# Altium footprint library Footprints.PcbLib: 76 footprints (part 4 of 5)
Each footprint in its own frame and in the unit in brackets; x right, y up, seen from the top. Pads: shape width x height; smd on the part's side, far side on the other; paste and mask are expansions set on the pad; w line width, h text height; cw(c..) or ccw(c..) is an arc to the next point about the centre after c.
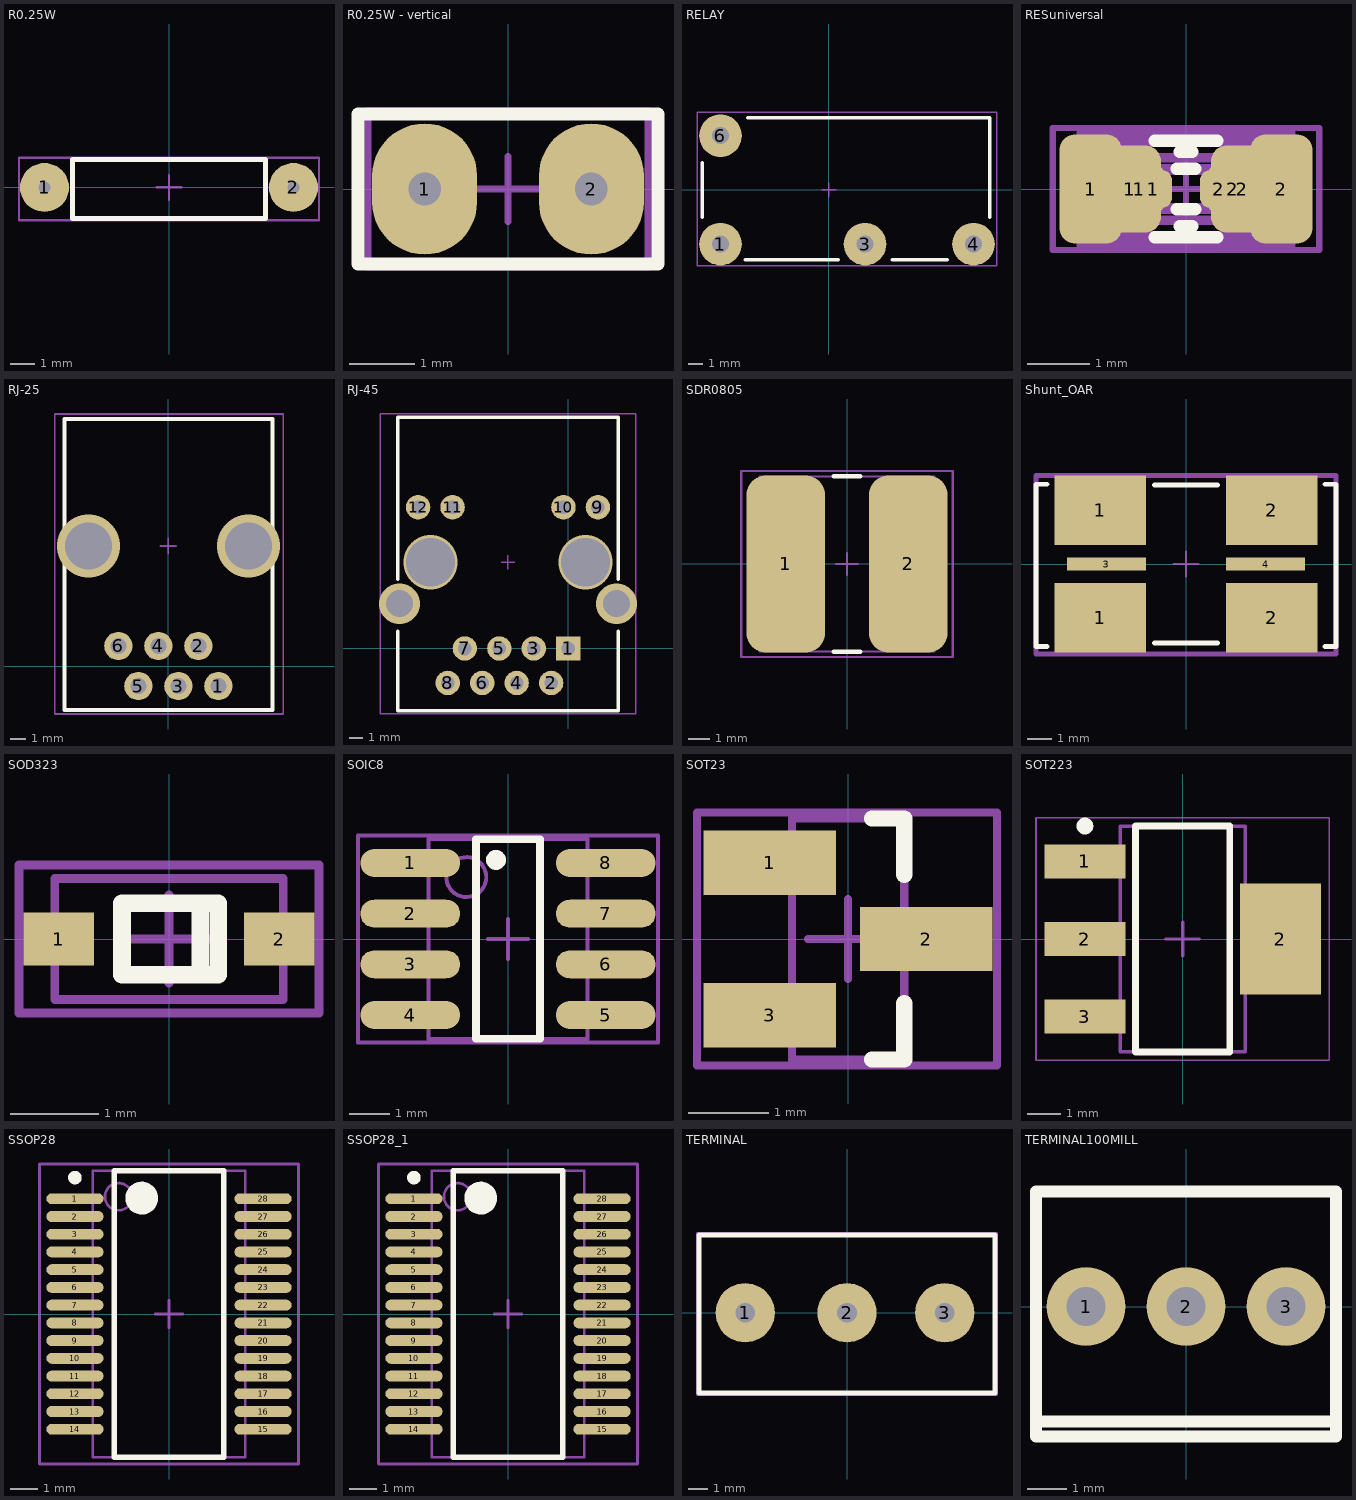
[diagram p3: the footprints below, top view; thin cyan lines are the x and y axes]

## R0.25W [mm] "Resistor, Axial; Body 10.5 x 3.3 mm (LxDia. max), Lead Dia. 0.7 mm (max)"
height 3.3
pads (2):
  round 2 hole 0.5: 1(-5.08,0) 2(5.08,0)
Top Overlay:
  lines w0.2: -3.937,-1.27 3.937,-1.27 3.937,1.143 -3.937,1.143 -3.937,-1.27
Mechanical 15:
  lines w0.1: -0.5,0 0.5,0 ; 0,-0.5 0,0.5 ; -6.121,-1.346 6.121,-1.346 6.121,1.219 -6.121,1.219 -6.121,-1.346
3D body "User Library-AXIAL_RESISTOR(0_25W).step": height 2.6, standoff -1.5, extent -5.4,-1.206 5.4,1.194

## R0.25W - vertical [mm] "Resistor, Axial; Body 10.5 x 3.3 mm (LxDia. max), Lead Dia. 0.7 mm (max)"
height 9
pads (2):
  oval 1.6x2 hole 0.5: 1(-1.27,0) 2(1.27,0)
Top Overlay:
  lines w0.2: -2.286,-1.143 -2.286,1.143 2.286,1.143 2.286,-1.143 -2.286,-1.143
Mechanical 15:
  lines w0.1: -0.5,0 0.5,0 ; 0,-0.5 0,0.5 ; -2.134,-1.194 -2.134,1.194 2.134,1.194 2.134,-1.194 -2.134,-1.194
3D body "User Library-Res_Stand.step": height 7.05, standoff -1.7, extent -2.192,-0.92 1.52,0.921

## RELAY [mm] "G6B-1177P(-FD)-ND-US"
height 15
pads (4):
  round 3 hole 1.2 paste+0 mask+0: 1(-7.62,-3.81) 3(2.54,-3.81) 4(10.16,-3.81) 6(-7.62,3.81)
Top Overlay:
  lines w0.254: -8.89,-1.905 -8.89,1.905 ; -5.875,-4.92 0.635,-4.92 ; -5.715,5.08 11.31,5.08 11.31,-1.905 ; 4.445,-4.92 8.295,-4.92
Mechanical 15:
  lines w0.1: -0.5,0 0.5,0 ; 0,-0.5 0,0.5 ; -9.271,-5.334 -9.271,5.461 11.811,5.461 11.811,-5.334 -9.271,-5.334
3D body: height 15, standoff 0, extent -8.89,-4.928 11.303,5.08

## RESuniversal [mm] "Chip Resistor 2-Leads, All sizes"
height 1.5
pads (8):
  rrect50% 1x1.75 smd: 1(-1.527,0) 2(1.527,0)
  rrect50% 1x1.4 smd: 1(-0.902,0) 2(0.902,0)
  rrect50% 0.8x0.85 smd: 1(-0.75,0) 2(0.75,0)
  rrect50% 0.6x0.6 smd: 1(-0.525,0) 2(0.525,0)
Top Overlay:
  lines w0.2: -0.5,-0.775 0.5,-0.775 ; -0.5,0.775 0.5,0.775 ; -0.15,-0.325 0.15,-0.325 ; -0.15,0.325 0.15,0.325 ; -0.1,-0.6 0.1,-0.6 ; -0.1,0.6 0.1,0.6
Mechanical 13:
  lines w0.1: -1.7,-0.9 1.7,-0.9 1.7,0.9 -1.7,0.9 -1.7,-0.9 ; -1.105,-0.725 1.105,-0.725 1.105,0.725 -1.105,0.725 -1.105,-0.725 ; -0.875,-0.475 -0.875,0.475 0.875,0.475 0.875,-0.475 -0.875,-0.475 ; -0.55,-0.275 -0.55,0.275 0.55,0.275 0.55,-0.275 -0.55,-0.275
Mechanical 15:
  lines w0.1: -0.475,0 0.475,0 ; -0.275,0 0.275,0 ; 0,-0.475 0,0.475 ; 0,-0.275 0,0.275 ; -2.134,-0.975 2.134,-0.975 2.134,0.975 -2.134,0.975 -2.134,-0.975 ; -1.473,-0.8 1.473,-0.8 1.473,0.8 -1.473,0.8 -1.473,-0.8 ; -1.225,-0.525 -1.225,0.525 1.225,0.525 1.225,-0.525 -1.225,-0.525 ; -0.925,-0.35 -0.925,0.35 0.925,0.35 0.925,-0.35 -0.925,-0.35 ; -0.5,0 0.5,0 -0.5,0 ; 0,-0.5 0,0.5 0,-0.5
3D body "1206 RES.step": height 0.55, standoff 0, extent -1.6,-0.8 1.6,0.8

## RJ-25 [mm] "RJ-25 ICD programmer connector"
height 12
pads (6):
  round 1.8 hole 1: 1(3.175,-1.27) 2(1.905,1.27) 3(0.635,-1.27) 4(-0.635,1.27) 5(-1.905,-1.27) 6(-3.175,1.27)
via -5.08,7.62 diameter 4 hole 3
via 5.08,7.62 diameter 4 hole 3
Top Overlay:
  lines w0.254: -6.604,15.697 -6.604,2.54 -6.604,-2.794 6.604,-2.794 6.604,2.54 6.604,15.697 ; -6.579,15.697 6.579,15.697
Mechanical 15:
  lines w0.1: -0.5,7.62 0.5,7.62 ; 0,7.12 0,8.12 ; -7.214,-3.048 7.29,-3.048 7.29,16.002 -7.214,16.002 -7.214,-3.048
3D body "User Library-XA53A-66-100111.STEP": height 11.5, standoff -3.8, extent -6.585,-2.541 6.715,15.659

## RJ-45 [mm] "RJ-45 Ethernet connector"
height 15
pads (12):
  rect 1.8x1.8 hole 1: 1(0,0)
  round 1.8 hole 1: 2(-1.27,-2.54) 3(-2.54,0) 4(-3.81,-2.54) 5(-5.08,0) 6(-6.35,-2.54) 7(-7.62,0) 8(-8.89,-2.54) 9(2.18,10.41) 10(-0.36,10.41) 11(-8.53,10.41) 12(-11.07,10.41)
via -12.433,3.302 diameter 3 hole 2
via 3.543,3.302 diameter 3 hole 2
via -10.16,6.35 diameter 4 hole 3.6
via 1.27,6.35 diameter 4 hole 3.6
Top Overlay:
  lines w0.254: -12.573,1.27 -12.573,-4.572 3.683,-4.572 3.683,1.27 ; -12.573,5.08 -12.573,17.018 3.683,17.018 3.683,5.08
Mechanical 15:
  lines w0.1: -4.945,6.35 -3.945,6.35 ; -4.445,5.85 -4.445,6.85 ; -13.843,-4.826 4.953,-4.826 4.953,17.272 -13.843,17.272 -13.843,-4.826
3D body "45857.stp": height 14.9, standoff -3.28, extent -13.608,-4.69 4.718,17.15

## SDR0805 [mm] "Precision Wire Wound Inductor, 2-Leads, Body 7,9x7,9mm, IPC Medium Density"
height 5.3
pads (2):
  rrect50% 3.6x8.1 smd: 1(-2.8,0) 2(2.8,0)
Top Overlay:
  lines w0.2: -0.6,-4 0.6,-4 ; -0.6,4 0.6,4
Mechanical 13:
  lines w0.1: -4,-4 -4,4 4,4 4,-4 -4,-4
Mechanical 15:
  lines w0.1: -0.5,0 0.5,0 ; 0,-0.5 0,0.5 ; -4.825,-4.25 -4.825,4.25 4.825,4.25 4.825,-4.25 -4.825,-4.25
3D body "SDR0805.step": height 5.05, standoff 0, extent -3.677,-3.75 3.677,3.75

## Shunt_OAR [mm] "Open Air Sense Resistors  Metal Alloy Strip 5W 12mmx7mm"
height 5
pads (6):
  rect 3.67x2.79 smd: 1(-3.45,-2.155) 1(-3.45,2.155) 2(3.45,-2.155) 2(3.45,2.155)
  rect 3.16x0.51 smd: 3(-3.195,0) 4(3.195,0)
Top Overlay:
  lines w0.2: -6.02,-0.737 -6.02,3.2 -5.588,3.2 ; -6.02,0.635 -6.02,-3.302 -5.588,-3.302 ; -1.27,-3.175 1.27,-3.175 ; -1.27,3.175 1.27,3.175 ; 5.588,-3.302 6.02,-3.302 6.02,0.635 ; 5.588,3.2 6.02,3.2 6.02,-0.737
Mechanical 15:
  lines w0.1: -0.5,0 0.5,0 ; 0,-0.5 0,0.5
  lines w0.2: -6.02,-3.607 -5.08,-3.607 6.02,-3.607 6.02,-2.87 6.02,3.556 3.632,3.556 -6.02,3.556 -6.02,-3.073 -6.02,-3.607
3D body "RES_OARS-XP.step": height 4.57, standoff 0, extent -6,-3.175 6,3.175

## SOD323 [mm] "SOD323 diode 2.5mmx1.25mm"
height 1.1
pads (2):
  rect 0.8x0.6 smd: 1(-1.25,0) 2(1.25,0)
Top Overlay:
  lines w0.2: 0.356,-0.356 0.356,0.406 ; -0.533,-0.406 -0.533,0.406 0.559,0.406 0.559,-0.406 -0.533,-0.406
Mechanical 13:
  lines w0.1: -1.295,-0.686 -1.295,0.686 1.295,0.686 1.295,-0.686 -1.295,-0.686
Mechanical 15:
  lines w0.1: -0.5,0 0.5,0 ; 0,-0.5 0,0.5 ; -1.702,-0.838 -1.702,0.838 1.702,0.838 1.702,-0.838 -1.702,-0.838
3D body "SOD323.step": height 1.1, standoff 0, extent -1.3,-0.675 1.3,0.675

## SOIC8 [mm] "SOIC, 8-Leads, Body 5,0x4,0mm (max), Pitch 1,27mm, IPC Low Density"
height 1.76
pads (8):
  oval 2.5x0.7 smd: 1(-2.45,1.905) 2(-2.45,0.635) 3(-2.45,-0.635) 4(-2.45,-1.905) 5(2.45,-1.905) 6(2.45,-0.635) 7(2.45,0.635) 8(2.45,1.905)
Top Overlay:
  circle w0.25: c-0.303,1.981 r0.125
  lines w0.2: -0.8,-2.5 -0.8,2.5 0.8,2.5 0.8,-2.5 -0.8,-2.5
Mechanical 13:
  circle w0.1: c-1.045,1.55 r0.5
  lines w0.1: -1.995,-2.5 -1.995,2.5 1.995,2.5 1.995,-2.5 -1.995,-2.5
Mechanical 15:
  lines w0.1: -0.5,0 0.5,0 ; 0,-0.5 0,0.5 ; -3.759,-2.591 -3.759,2.591 3.759,2.591 3.759,-2.591 -3.759,-2.591
3D body "SOIC-8.step": height 1.75, standoff 0, extent -3,-2.45 3,2.45

## SOT23 [mm] "SOT23, 3-Leads, Body 3,0x2,5mm (max), Pitch 0,95mm, IPC Low Density"
height 1.1
pads (3):
  rect 1.65x0.8 smd: 1(-0.975,0.95) 2(0.975,0) 3(-0.975,-0.95)
Top Overlay:
  lines w0.2: 0.3,-1.5 0.7,-1.5 0.7,-0.8 ; 0.3,1.5 0.7,1.5 0.7,0.8
Mechanical 13:
  lines w0.1: -0.7,-1.5 -0.7,1.5 0.7,1.5 0.7,-1.5 -0.7,-1.5
Mechanical 15:
  lines w0.1: -0.5,0 0.5,0 ; 0,-0.5 0,0.5 ; -1.88,-1.575 -1.88,1.575 1.854,1.575 1.854,-1.575 -1.88,-1.575
3D body "SOT23-3.step": height 1.08, standoff 0, extent -1.32,-1.5 1.32,1.5

## SOT223 [mm] "SOT223, 4-Leads, Body 6.5x3.5mm, Pitch 2.3mm, Lead Span 7mm, IPC Medium Density"
height 1.8
pads (4):
  rect 2.4x1 smd: 1(-2.9,2.3) 2(-2.9,0) 3(-2.9,-2.3)
  rect 2.4x3.3 smd: 2(2.9,0)
Top Overlay:
  circle w0.25: c-2.9,3.35 r0.125
  lines w0.2: -1.4,-3.35 -1.4,3.35 1.4,3.35 1.4,-3.35 -1.4,-3.35
Mechanical 13:
  lines w0.1: -1.855,-3.35 -1.855,3.35 1.855,3.35 1.855,-3.35 -1.855,-3.35
Mechanical 15:
  lines w0.05: -4.35,-3.6 -4.35,3.6 4.35,3.6 4.35,-3.6 -4.35,-3.6
  lines w0.1: -0.5,0 0.5,0 ; 0,-0.5 0,0.5
3D body "SOT-223.step": height 1.64, standoff -0.01, extent -3.5,-3.25 3.5,3.25

## SSOP28 [mm] "SOP, 28-Leads, Body 10,5x5,6mm (max), Pitch 0,65mm, IPC Medium Density"
height 2
pads (28):
  oval 2.1x0.4 smd mask+0.05: 1(-3.45,4.225) 2(-3.45,3.575) 3(-3.45,2.925) 4(-3.45,2.275) 5(-3.45,1.625) 6(-3.45,0.975) 7(-3.45,0.325) 8(-3.45,-0.325) 9(-3.45,-0.975) 10(-3.45,-1.625) 11(-3.45,-2.275) 12(-3.45,-2.925) 13(-3.45,-3.575) 14(-3.45,-4.225) 15(3.45,-4.225) 16(3.45,-3.575) 17(3.45,-2.925) 18(3.45,-2.275) 19(3.45,-1.625) 20(3.45,-0.975) 21(3.45,-0.325) 22(3.45,0.325) 23(3.45,0.975) 24(3.45,1.625) 25(3.45,2.275) 26(3.45,2.925) 27(3.45,3.575) 28(3.45,4.225)
Top Overlay:
  circle w0.25: c-3.45,5 r0.125
  circle w0.6: c-1,4.25 r0.3
  lines w0.2: -2,-5.25 -2,5.25 2,5.25 2,-5.25 -2,-5.25
Mechanical 13:
  circle w0.1: c-1.85,4.3 r0.5
  lines w0.1: -2.8,-5.25 -2.8,5.25 2.8,5.25 2.8,-5.25 -2.8,-5.25
Mechanical 15:
  lines w0.1: -0.5,0 0.5,0 ; 0,-0.5 0,0.5 ; -4.75,-5.5 -4.75,5.5 4.75,5.5 4.75,-5.5 -4.75,-5.5
3D body "SSOP-28-1.step": height 2.15, standoff 0, extent -3.878,-5.207 3.878,5.123

## SSOP28_1 [mm] "SOP, 28-Leads, Body 10,5x5,6mm (max), Pitch 0,65mm, IPC Medium Density"
height 2
pads (28):
  oval 2.1x0.4 smd mask+0.05: 1(-3.45,4.225) 2(-3.45,3.575) 3(-3.45,2.925) 4(-3.45,2.275) 5(-3.45,1.625) 6(-3.45,0.975) 7(-3.45,0.325) 8(-3.45,-0.325) 9(-3.45,-0.975) 10(-3.45,-1.625) 11(-3.45,-2.275) 12(-3.45,-2.925) 13(-3.45,-3.575) 14(-3.45,-4.225) 15(3.45,-4.225) 16(3.45,-3.575) 17(3.45,-2.925) 18(3.45,-2.275) 19(3.45,-1.625) 20(3.45,-0.975) 21(3.45,-0.325) 22(3.45,0.325) 23(3.45,0.975) 24(3.45,1.625) 25(3.45,2.275) 26(3.45,2.925) 27(3.45,3.575) 28(3.45,4.225)
Top Overlay:
  circle w0.25: c-3.45,5 r0.125
  circle w0.6: c-1,4.25 r0.3
  lines w0.2: -2,-5.25 -2,5.25 2,5.25 2,-5.25 -2,-5.25
Mechanical 13:
  circle w0.1: c-1.85,4.3 r0.5
  lines w0.1: -2.8,-5.25 -2.8,5.25 2.8,5.25 2.8,-5.25 -2.8,-5.25
Mechanical 15:
  lines w0.1: -0.5,0 0.5,0 ; 0,-0.5 0,0.5 ; -4.75,-5.5 -4.75,5.5 4.75,5.5 4.75,-5.5 -4.75,-5.5
3D body "SSOP-28.step": height 1.95, standoff -0.05, extent -3.906,-5.1 3.906,5.1

## TERMINAL [mm] "Skrew terminal 5mm"
height 10
pads (3):
  round 3 hole 1: 1(-5.156,0) 2(0,0) 3(4.953,0)
Top Overlay:
  lines w0.254: -7.493,-4.064 7.493,-4.064 7.493,3.937 -7.493,3.937 -7.493,-4.064
Mechanical 15:
  lines w0.1: -0.5,0 0.5,0 ; 0,-0.5 0,0.5 ; -7.595,-4.166 7.595,-4.166 7.595,4.039 -7.595,4.039 -7.595,-4.166
3D body "User Library-STELVIO-CII-5-3-250V-17A.step": height 10, standoff -4.8, extent -7.5,-4.063 7.5,3.937

## TERMINAL100MILL [mm] "Skrew terminal 2.54mm"
height 8.5
pads (3):
  round 2 hole 1: 1(-2.54,0) 2(0,0) 3(2.54,0)
Top Overlay:
  lines w0.3: -3.81,-2.921 3.81,-2.921 ; -3.81,-3.302 3.81,-3.302 3.81,2.921 -3.81,2.921 -3.81,-3.302
Mechanical 15:
  lines w0.1: -0.5,0 0.5,0 ; 0,-0.5 0,0.5 ; -3.81,-3.302 3.81,-3.302 3.81,2.921 -3.81,2.921 -3.81,-3.302
3D body "Terminal3 2.54.step": height 8.64, standoff -1.91, extent -3.778,-3.302 3.778,2.921